# Altium schematic symbol library AD_Lib.SchLib: 1239 symbols (part 3 of 9) (continued)
## IC_LT3011EDD#PBF
designator IC?, comment LT3011
ÎÈÑ¹Ð¾Æ¬; LDO;3~80V;50mA;ADJ; Manufacturer: ADI; Value: 3.0V~80V,50mA; Quality: -40~125¡æ; pro-environment: RoHS; OPN: LT3011EDD#PBF; PadsNum: 0; SN: SN; Category: ¼¯³ÉÐ¾Æ¬; Part: LT3011; QTY: 121; Price: 17.7523; OPN_JLC: OPN_JLC; SN_JLC: SN_JLC; Price_JLC: 0
footprint DFN-10_3x3 (SON, 10-Leads, Body 3x3mm, Pitch 0.5mm, Microchip Recommended)
pins: 1 OUT (out), 2 ADJ (in), 3 GND (power), 4 NC, 5 PGD (out), 6 CT (out), 7 NC, 8 ~{SHDN} (in), 9 NC, 10 IN (in), 11 EPAD

## IC_LT4356IDE-1#PBF
designator IC?, comment LT4356
MOSFETÇý¶¯; Manufacturer: Linear; Quality: -40~125¡æ; Value: ADJ,4~80V; pro-environment: RoHS; SN: 03.4.11.11.75435601S; OPN: LT4356IDE-1#PBF; PadsNum: 0; Category: ¼¯³ÉÐ¾Æ¬; Part: LT4356; QTY: 91; Price: ?; OPN_JLC: OPN_JLC; SN_JLC: SN_JLC; Price_JLC: 0
footprint DFN-12_4x3 (SON, 12-Leads, Body 4x3mm, Pitch 0.5mm, Microchip Recommended)
pins: 0 GND (power), 1 TMR (in), 2 FB (in), 3 OUT (in), 4 GATE (out), 5 SNS (in), 6 VCC (power), 7 ~{SHDN} (in), 8 ~{FLT} (oc), 9 EN (in), 10 GND (power), 11 AOUT (out), 12 IN+ (in)

## IC_LT8302IS8E#PBF
designator IC?, comment LT8302
·´¼¤¿ØÖÆÆ÷£¬2.8~42V,3.5A/65V; Manufacturer: Linear; Quality: -40~125¡æ; pro-environment: RoHS; SN: 03.4.11.11.83830201S; OPN: LT8302IS8E#PBF; PadsNum: 0; Value: 2.8~42V,3.5A/65V; other: ·´¼¤¿ØÖÆÆ÷; Category: ¼¯³ÉÐ¾Æ¬; Part: LT8302; QTY: 100; Price: ?; OPN_JLC: OPN_JLC; SN_JLC: SN_JLC; Price_JLC: 0
footprint SO-8_HT (SOIC, 8-Leads, Body 4.9x3.9mm, Pitch 1.27mm, IPC Low Density)
pins: 1 EN (in), 2 INTVcc (out), 3 Vin (in), 4 GND (power), 5 SW, 6 Rfb (in), 7 Rref (in), 8 TC (in), 9 EP (power)
text: ·´¼¤; ¿Ø; ÖÆ; Æ÷

## IC_LT8471EFE#PBF
designator IC?, comment LT8471
Dual Multitopology DC/DC Converters with 2A Switches and Synchronization; Manufacturer: Linear; Quality: -40~125¡æ; Value: ADJ,4~80V; pro-environment: RoHS; OPN: LT8471EFE#PBF; PadsNum: 0; Part: LT8471; QTY: 91; Price: ?; OPN_JLC: OPN_JLC; SN_JLC: SN_JLC; Price_JLC: 0
footprint IC_LT8711EFE#PBF (FE Package 20-Lead Plastic TSSOP (4.4mm))
pins: 1 C1 (power), 2 E1 (power), 3 VIN1 (power), 4 PG1 (out), 5 FB1 (in), 6 OV/UV (in), 7 RT (in), 8 SS1 (power), 9 SYNC (in), 10 GND (power), 11 GND (power), 12 GND (power), 13 C3 (power), 14 SHOUT (power), 15 SS2 (power), 16 FB2 (in), 17 PG2 (out), 18 VIN2 (power), 19 E2 (power), 20 C2 (power), 21 GND (power) "Exposed Pad"

## IC_LTC1569CS87PBF
designator IC?, comment LTC1569-7
µÍÍ¨ÂË²¨Æ÷£¬3V~¡À5V£¬10½×; Manufacturer: Linear; Quality: -40~85¡æ; pro-environment: RoHS; SN: 03.4.11.13.83156901S; other: µÍÍ¨ÂË²¨Æ÷£¬3V~5V£¬10½×; OPN: LTC1569CS87PBF; PadsNum: 0; Value: 3V~¡À5V; Category: ¼¯³ÉÐ¾Æ¬; Part: LTC1569-7; QTY: 100; Price: ?; OPN_JLC: OPN_JLC; SN_JLC: SN_JLC; Price_JLC: 0
footprint SO-8 (SOIC, 8-Leads, Body 4.9x3.9mm, Pitch 1.27mm, IPC Low Density)
pins: 1 IN+ (in), 2 IN- (in), 3 GND (power), 4 V- (power), 5 DIV/CLK (in), 6 Rx, 7 V+ (power), 8 Vout (out)
text: µÍÍ¨; ÂË; ²¨; Æ÷

## IC_LTC3637IMSE#PBF
designator IC?, comment LTC3637
ÎÈÑ¹Ð¾Æ¬; ¿ª¹ØÐÍ; Êä³öµçÁ÷1A; Manufacturer: Linear; pro-environment: RoHS; Quality: -40~125¡æ; SN: 03.4.11.11.99363701S; Value: 76V,1A; OPN: LTC3637IMSE#PBF; PadsNum: 0; Category: ¼¯³ÉÐ¾Æ¬; Part: LTC3637; QTY: 37; Price: ?; OPN_JLC: OPN_JLC; SN_JLC: SN_JLC; Price_JLC: 0
footprint MSOP-16_HT (SOIC, 14-Leads, Body 8.7x3.9mm, Pitch 1.27mm, IPC Medium Density)
pins: 1 SW (out), 3 VIN (in), 5 FBO (out), 6 PG2 (in), 7 PG1 (in), 8 GND (power), 9 VFB (in), 10 SS (in), 11 Iset (in), 12 OVLO (in), 14 RUN (in), 16 GND (power), 17 HT

## IC_LTC6090CS8E#PBF
designator IC?, comment LTC6090
¸ßÑ¹ÔË·Å; Vs=9.5~140V; Manufacturer: ADI; Quality: -40~85¡æ; Value: 50mA;9.5V~140V;; pro-environment: RoHS; other: Vs=9.5~140V;SR=24V/us; OPN: LTC6090CS8E#PBF; PadsNum: 0; SN: SN; Category: ¼¯³ÉÐ¾Æ¬; Part: LTC6090; QTY: 100; Price: 33.4932; OPN_JLC: OPN_JLC; SN_JLC: SN_JLC; Price_JLC: 0
footprint SO-8_HT2 (SOIC, 8-Leads, Body 4.9x3.9mm, Pitch 1.27mm, IPC Low Density)
part A pins: 2 IN- (in), 3 IN+ (in), 6 OUT (out)
part B pins: 1 COM, 4 V- (power), 5 ~{TFLAG}, 7 V+ (power), 8 ~{OD} (in), 9 TH
part A text: Vcc; Vee

## IC_M45PE80-VMP6G
designator IC?, comment M45PE80
NOR Flash,64Mb; Manufacturer: Micron; pro-environment: RoHS; Quality: -40~85¡æ; SN: 03.4.11.16.70PE8001S; Value: 64Mb,3.3V; OPN: M45PE80-VMP6G; PadsNum: 0; Category: ¼¯³ÉÐ¾Æ¬; Part: M45PE80; QTY: 490; Price: ?; OPN_JLC: OPN_JLC; SN_JLC: SN_JLC; Price_JLC: 0
footprint VFQFPN-8 (Footprint not found)
pins: 1 SI (in), 2 SCK (in), 3 ~{RST} (in), 4 ~{CS} (in), 5 ~{WP} (in), 6 VCC (power), 7 GND (power), 8 SO (out)
text: NOR; Flash; 64Mbit

## IC_MAX539BESA+
designator IC?, comment MAX539
DA,1CH,SPI; Manufacturer: Maxim; Quality: -40~85¡æ; Value: 0.25V/us,12bit; pro-environment: RoHS; SN: 03.4.11.17.83539B01S; other: 1CH;12bit;4.5V~5.5V; OPN: MAX539BESA+; PadsNum: 0; Category: ¼¯³ÉÐ¾Æ¬; Part: MAX539; QTY: 100; Price: 42.12; OPN_JLC: OPN_JLC; SN_JLC: SN_JLC; Price_JLC: 0
footprint SO-8 (SOIC, 8-Leads, Body 4.9x3.9mm, Pitch 1.27mm, IPC Low Density)
pins: 1 DIN (in), 2 SCLK (in), 3 ~{CS} (in), 4 DOUT (out), 5 AGND (power), 6 RefIn (power), 7 VOUT (out), 8 VDD (power)
text: DA; ×ª; »»; Æ÷

## IC_MAX3221IPW
designator IC?, comment MAX3221
RS232ÊÕ·¢Æ÷; Manufacturer: TI; Quality: -40~85¡æ; Value: 250kbit/s,3~5.5V; pro-environment: RoHS; OPN: MAX3221IPW; PadsNum: 0; SN: SN; Category: ¼¯³ÉÐ¾Æ¬; Part: MAX3221; QTY: 90; Price: 11.5479; OPN_JLC: OPN_JLC; SN_JLC: SN_JLC; Price_JLC: 0
footprint TSSOP-14 (Shrink Small Outline; 14 Leads; Body Width 4.4 mm; Pitch 0.65 mm)
pins: 1 ~{EN} (in), 2 C1+, 3 V+, 4 C1-, 5 C2+, 6 C2-, 7 V-, 8 RIN (in), 9 ROUT (out), 10 ~{INVALID} (out), 11 DIN (in), 12 FORCEON (in), 13 DOUT (out), 14 GND (power), 15 VCC (power), 16 ~{FORCEOFF} (in)

## IC_MAX5741EUB+
designator IC?, comment MAX5741
DA;SPI;125kS/s;4Í¨µÀ;; Manufacturer: Maxim; Quality: -40~105¡æ; Value: 125 kS/s,10bit; pro-environment: RoHS; other: 125 kS/s;10bit;2.7V~5.5V; OPN: MAX5741EUB+; PadsNum: 0; SN: SN; Category: ¼¯³ÉÐ¾Æ¬; Part: MAX5741; QTY: 50; Price: 44.5672; OPN_JLC: OPN_JLC; SN_JLC: SN_JLC; Price_JLC: 0
footprint MSOP-10 (Body Width 3 mm; Pitch 0.5 mm;(uMAX-10&RM-10))
pins: 1 ~{CS} (in), 2 SCLK (in), 3 VDD (power), 4 GND (power), 5 DIN (in), 6 RefIn (in), 7 VoutA (out), 8 VoutB (out), 9 VoutC (out), 10 VoutD (out)
text: DA; ×ª; »»; Æ÷

## IC_MAX7219ENG+
designator IC?, comment MAX7219
ÊýÂë¹ÜÇý¶¯,SPI,8*8,5V; Manufacturer: Maxim; pro-environment: RoHS; Quality: -40~85¡æ; SN: 03.4.11.20.11721901S; Value: SPI,5V; OPN: MAX7219ENG+; other: SPI;8Seg*8Bit;4~5.5V;-2~5mA; PadsNum: 0; Category: ¼¯³ÉÐ¾Æ¬; Part: MAX7219; QTY: 15; Price: 64.0341; OPN_JLC: OPN_JLC; SN_JLC: SN_JLC; Price_JLC: 0
footprint DIP-24 (DIP, 24-Leads, Row Spacing 7.62mm, Pitch 2.54mm, Body 30.55x6.99mm)
pins: 1 DIN (in), 2 DIG0 (out), 3 DIG4 (out), 4 GND (power), 5 DIG6 (out), 6 DIG2 (out), 7 DIG3 (out), 8 DIG7 (out), 9 GND (power), 10 DIG5 (out), 11 DIG1 (out), 12 LOAD (in), 13 CLK (in), 14 SEG A (out), 15 SEG F (out), 16 SEG B (out), 17 SEG G (out), 18 ISET, 19 V+ (power), 20 SEG C (out), 21 SEG E (out), 22 SEG DP (out), 23 SEG D (out), 24 DOUT (out)

## IC_MAX7426EUA
designator IC?, comment MAX7426
µÍÍ¨ÂË²¨Æ÷; 2.7~3.6V; 5½×; 12kHz; Manufacturer: Maxim; Quality: -40~85¡æ; Value: 2.7V~3.6V; pro-environment: RoHS; other: µÍÍ¨ÂË²¨Æ÷, 2.7V~3.6V, 5½×, 12KHz; OPN: MAX7426EUA; PadsNum: 0; SN: SN; Category: ¼¯³ÉÐ¾Æ¬; Part: MAX7426; QTY: 50; Price: 15.1983; OPN_JLC: OPN_JLC; SN_JLC: SN_JLC; Price_JLC: 0
footprint MSOP-8 (Shrink Small Outline; 8 Leads; Body Width 3 mm; Pitch 0.65 mm)
pins: 1 COM (in), 2 IN (in), 3 GND (power), 4 VDD (power), 5 OUT (out), 6 OS, 7 ~{SHDN} (in), 8 CLK (in)
text: µÍÍ¨; ÂË; ²¨; Æ÷

## IC_MAX11628EEE+
designator IC?, comment MAX11628
AD, 8Í¨µÀ, 12bit, SPI, 5V; Manufacturer: Maxim; Quality: -40~85¡æ; Value: 300 kS/s£¬12bit; pro-environment: RoHS; other: 300 kS/s;12bit;4.75V~5.25V; OPN: MAX11628EEE+; PadsNum: 0; SN: SN; Category: ¼¯³ÉÐ¾Æ¬; Part: MAX11628; QTY: 100; Price: 31.7538; OPN_JLC: OPN_JLC; SN_JLC: SN_JLC; Price_JLC: 0
footprint QSOP-16 (Footprint not found)
pins: 1 AIN0 (in), 2 AIN1 (in), 3 AIN2 (in), 4 AIN3 (in), 5 AIN4 (in), 6 AIN5 (in), 7 AIN6 (in), 8 AIN7/~{CNST} (in), 9 REF (in), 10 GND (power), 11 VDD (power), 12 ~{CS} (power), 13 SCLK (in), 14 DIN (in), 15 DOUT (out), 16 ~{EOC} (out)
text: AD; ×ª»»Æ÷; 12bit, SPI

## IC_MAX13487EESA
designator IC?, comment MAX13487
RS485ÊÕ·¢Æ÷,°ëË«¹¤,×ÔÊÕ·¢,4.75~5.25V; Manufacturer: Maxim; Quality: -40~85¡æ; Value: RS485,500kbps; pro-environment: RoHS; OPN: MAX13487EESA; PadsNum: 8; SN: SN; other: 4.75~5.25V; Category: ¼¯³ÉÐ¾Æ¬; Part: MAX13487; QTY: 75; Price: 4.03; OPN_JLC: MAX13487EESA; SN_JLC: C18347; Price_JLC: 4.03
footprint SO-8 (SOIC, 8-Leads, Body 4.9x3.9mm, Pitch 1.27mm, IPC Low Density)
pins: 1 R (out), 2 ~{RE} (in), 3 ~{SHDN} (in), 4 D (in), 5 GND (power), 6 A (io), 7 B (io), 8 VCC (power)

## IC_MAX14932
designator IC?, comment MAX14932
Êý×Ö¸ôÀëÆ÷,1In1Out,2.7~5.5V; Manufacturer: Maxim; Quality: -40~125°C; pro-environment: RoHS; Value: 150MBd; PadsNum: 0; Category: Digital Isolators; OPN: MAX14932; Part: MAX14932; QTY: 100; OPN_JLC: OPN_JLC; Price_JLC: 0
footprint SOIC127P1032X265-16N
pins: 1 VDDA (power), 2 GNDA (power), 3 INA1 (in), 4 INA2 (in), 5 OUTA1 (out), 6 OUTA2 (out), 7 ENA (in), 8 GNDA (power), 9 GNDB (power), 10 ENB (in), 11 INB2 (in), 12 INB1 (in), 13 OUTB2 (out), 14 OUTB1 (out), 15 GNDB (power), 16 VDDB (power)

## IC_MC74HC74ADG
designator IC?, comment MC74HC74A
D´¥·¢Æ÷;2P;3.3/5V; Manufacturer: ON; pro-environment: RoHS; Quality: -40~125¡æ; SN: 03.4.11.18.84HC7401S; Value: D-Type Flip-Flop; OPN: MC74HC74ADG; other: Vcc=2V~6V;D´¥·¢Æ÷; PadsNum: 0; Category: ¼¯³ÉÐ¾Æ¬; Part: MC74HC74A; QTY: 55; Price: 1.09161; OPN_JLC: OPN_JLC; SN_JLC: SN_JLC; Price_JLC: 0
footprint SO-14 (14-Pin Small Outline Integrated Circuit 1.27 mm Pitch, IPC Low Density)
pins: 1 RST1 (in), 2 DAT1 (in), 3 CLK1 (in), 4 SET1 (in), 5 Q1 (out), 6 ~{Q1} (out), 7 GND (power), 8 ~{Q2} (out), 9 Q2 (out), 10 SET2 (in), 11 CLK2 (in), 12 DAT2 (in), 13 RST2 (in), 14 VCC (power)
text: D ´¥·¢Æ÷

## IC_MC74HC74ADR2G
designator IC?, comment MC74HC74A
D´¥·¢Æ÷,2P;3.3/5V; Manufacturer: ON; pro-environment: RoHS; Quality: -40~125¡æ; Value: D-Type Flip-Flop; OPN: MC74HC74ADR2G; other: Vcc=2V~6V;D´¥·¢Æ÷; PadsNum: 0; SN: SN; Category: ¼¯³ÉÐ¾Æ¬; Part: MC74HC74A; QTY: 55; Price: 1.09161; OPN_JLC: OPN_JLC; SN_JLC: SN_JLC; Price_JLC: 0
footprint SO-14 (14-Pin Small Outline Integrated Circuit 1.27 mm Pitch, IPC Low Density)
pins: 1 RST1 (in), 2 DAT1 (in), 3 CLK1 (in), 4 SET1 (in), 5 Q1 (out), 6 ~{Q1} (out), 7 GND (power), 8 ~{Q2} (out), 9 Q2 (out), 10 SET2 (in), 11 CLK2 (in), 12 DAT2 (in), 13 RST2 (in), 14 VCC (power)
text: D ´¥·¢Æ÷

## IC_MC74VHC1G86DTT1G
designator IC?, comment MC74VHC1G86
Âß¼­ÃÅ_Òì»òÃÅ,1P,2.0~5.5V; Manufacturer: ON; pro-environment: RoHS; Quality: -40~85¡æ; SN: 03.4.11.18.491G8601S; Other: µ¥Í¨µÀ2ÊäÈëÒì»òÃÅ; Value: XOR,2.0~5.5V; OPN: MC74VHC1G86DTT1G; PadsNum: 0; Category: ¼¯³ÉÐ¾Æ¬; Part: MC74VHC1G86; QTY: 3000; Price: 0.44694; OPN_JLC: OPN_JLC; SN_JLC: SN_JLC; Price_JLC: 0
footprint SOT353_M (SOT353, 5-Leads, Body 2x1.3mm, Pitch 0.65mm, Lead Span 2.1mm, IPC Low Density)
footprint SOT23-5 (SOT23, 5-Leads, Body 2.9x1.6mm, Pitch 0.95mm, Lead Span 2.7mm, IPC Low Density)
pins: 1 A (in), 2 B (in), 3 GND (power), 4 Y (out), 5 VDD (power)
text: Vcc; XOR; Gnd

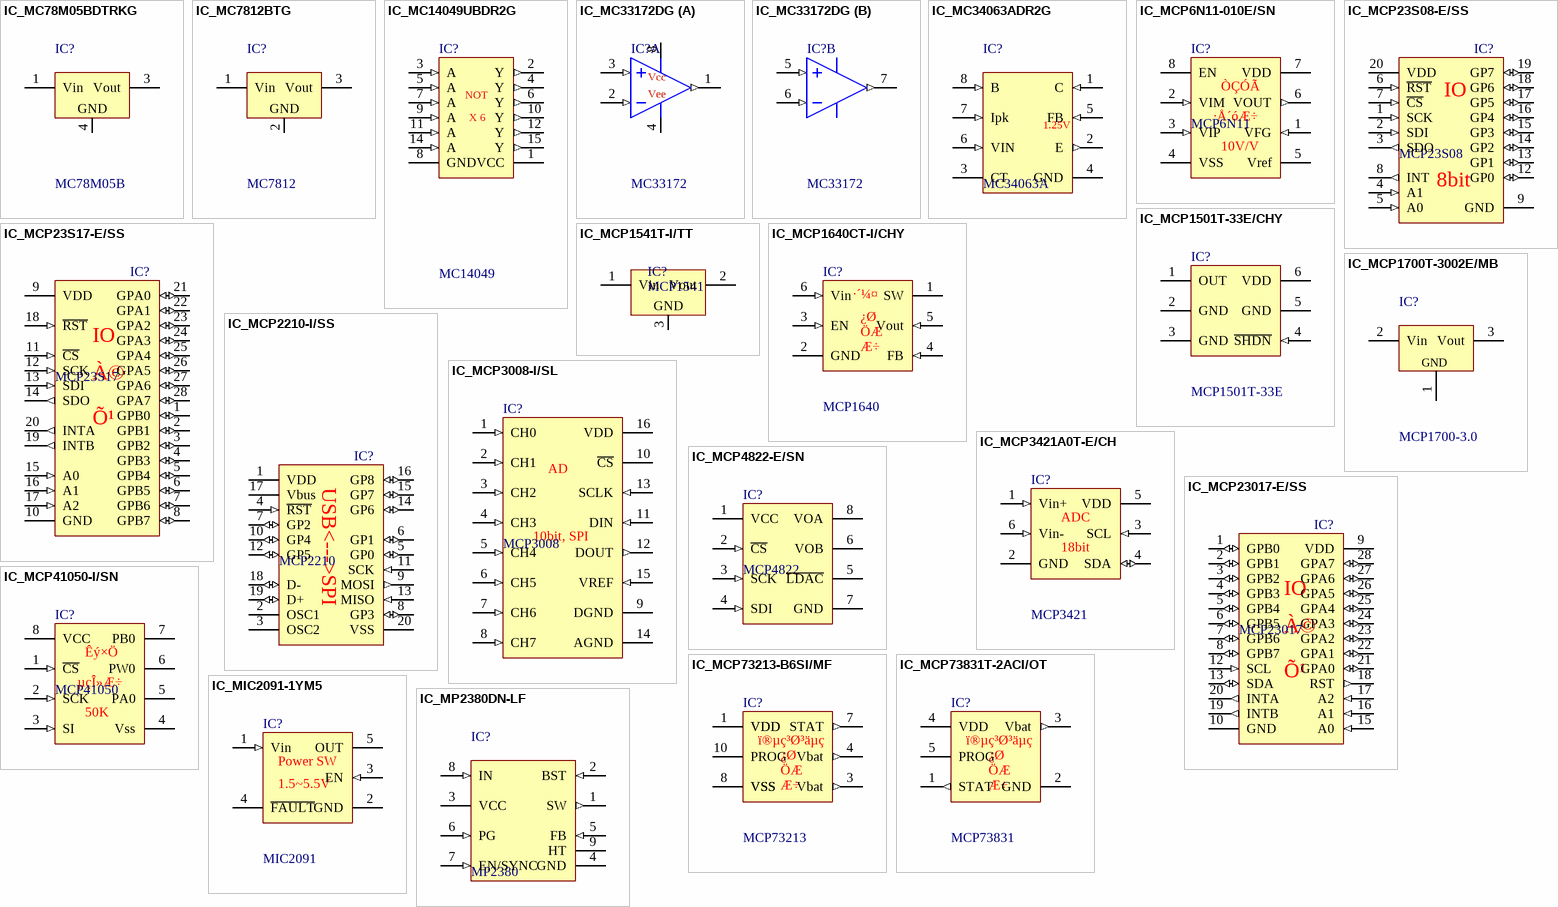
[diagram p12: symbols IC_MC78M05BDTRKG to IC_MP2380DN-LF]

## IC_MC78M05BDTRKG
designator IC?, comment MC78M05B
ÎÈÑ¹Ð¾Æ¬; LDO; Êä³öµçÁ÷0.5A; Manufacturer: ON; pro-environment: RoHS; Quality: -40~85¡æ; SN: 03.4.11.13.31780501S; Value: 35V,0.5A; OPN: MC78M05BDTRKG; PadsNum: 0; Category: ¼¯³ÉÐ¾Æ¬; Part: MC78M05B; QTY: 2500; Price: 1.2168; OPN_JLC: OPN_JLC; SN_JLC: SN_JLC; Price_JLC: 0
footprint TO252-3 (D-PAK, 4-Leads, Body 6.1x6.5mm, Pitch 2.28mm, Lead Span 9.8mm, IPC Low Density)
pins: 1 Vin, 3 Vout, 4 GND (power)

## IC_MC7812BTG
designator IC?, comment MC7812
ÎÈÑ¹Ð¾Æ¬; LDO; 12V/1A; Manufacturer: ON; pro-environment: RoHS; Quality: -40~125¡æ; Value: 12V,1A; OPN: MC7812BTG; PadsNum: 0; SN: SN; Category: ¼¯³ÉÐ¾Æ¬; Part: MC7812; QTY: 50; Price: ?; OPN_JLC: MC7812BTG; SN_JLC: C45387; Price_JLC: 1.93
footprint TO220-3 (TO, Thru-Hole, Vertical, Heatsink Mounted; 3 In-Line Leads; Pitch 2.54 mm)
pins: 0 GND (power), 1 Vin, 2 GND (power), 3 Vout

## IC_MC14049UBDR2G
designator IC?, comment MC14049
Âß¼­ÃÅ_·ÇÃÅ; 6P; 3.0~18V; Manufacturer: ON Semiconductor; pro-environment: RoHS; Quality: -55~150¡æ; Value: NOT,3.0~18V; OPN: MC14049UBDR2G; PadsNum: 16; SN: SN; Category: ¼¯³ÉÐ¾Æ¬; Part: MC14049; QTY: 2500; Price: 1.01135; OPN_JLC: MC14049UBDR2G; SN_JLC: C233449; Price_JLC: 0.8721
footprint SO-16_N (SOIC, 16-Leads, Body 9.9x3.9mm, Pitch 1.27mm, IPC Medium Density)
pins: 1 VCC (power), 2 Y (out), 3 A (in), 4 Y (out), 5 A (in), 6 Y (out), 7 A (in), 8 GND (power), 9 A (in), 10 Y (out), 11 A (in), 12 Y (out), 14 A (in), 15 Y (out)
text: NOT; X 6

## IC_MC33172DG
designator IC?, comment MC33172
OPA; 2P; Io=0.31A; Manufacturer: ON; Quality: -40~85¡æ; Value: ¡À1.5V~¡À12V;3V~24V;; pro-environment: RoHS; other: Io=310mA;SR=53V/us; OPN: MC33172DG; PadsNum: 0; SN: SN; Category: ¼¯³ÉÐ¾Æ¬; Part: MC33172; QTY: 98; Price: ?; OPN_JLC: OPN_JLC; SN_JLC: SN_JLC; Price_JLC: 0
footprint SO-8 (SOIC, 8-Leads, Body 4.9x3.9mm, Pitch 1.27mm, IPC Low Density)
part A pins: 1 OUTA (out), 2 INA- (in), 3 INA+ (in), 4 VEE (power), 8 VCC (power)
part B pins: 5 INB+ (in), 6 INB- (in), 7 OUTB (out)
part A text: Vcc; Vee

## IC_MC34063ADR2G
designator IC?, comment MC34063A
ÎÈÑ¹Ð¾Æ¬; ¿ª¹ØÐÍ; Éý½µÑ¹; 3~40V; 1.5A; Manufacturer: ON; pro-environment: RoHS; Quality: -0~70¡æ; Value: 40V,1.5A; OPN: MC34063ADR2G; other: Vin=3V~40V,Éý½µÑ¹, Iout=1.5A; PadsNum: 8; SN: SN; Category: ¼¯³ÉÐ¾Æ¬; Part: MC34063A; QTY: 2500; Price: ?; OPN_JLC: MC34063ADR2G; SN_JLC: C32078; Price_JLC: 1.7
footprint IC_MC34063ADR2G (¿íÌåSO8,Ìå¿í150mil)
pins: 1 C (in), 2 E (out), 3 CT, 4 GND (power), 5 FB (in), 6 VIN (in), 7 Ipk (in), 8 B (in)
text: 1.25V

## IC_MCP6N11-010E/SN
designator IC?, comment MCP6N11
ÒÇÓÃÔË·Å;10V/V;1.8V~5.5V; Manufacturer: Microchip; pro-environment: RoHS; Quality: -40~85¡æ; OPN: MCP6N11-010E/SN; other: ÒÇÓÃÔË·Å,10V/V,1.8V~5.5V; PadsNum: 0; SN: SN; Value: 10V/V;1.8V~5.5V; Category: ¼¯³ÉÐ¾Æ¬; Part: MCP6N11; QTY: 100; Price: 8.3636; OPN_JLC: OPN_JLC; SN_JLC: SN_JLC; Price_JLC: 0
footprint SO-8 (SOIC, 8-Leads, Body 4.9x3.9mm, Pitch 1.27mm, IPC Low Density)
pins: 1 VFG (in), 2 VIM (in), 3 VIP (in), 4 VSS (power), 5 Vref, 6 VOUT (out), 7 VDD (power), 8 EN (power)
text: ÒÇÓÃ; ·Å´óÆ÷; 10V/V

## IC_MCP23S08-E/SS
designator IC?, comment MCP23S08
IO Expanders ,8bit,SPIC; Manufacturer: Microchip; Value: 1.8V~5.5V,8bit; Quality: -40~125°C; other: IO Expanders;1.8V~5.5V;8bit;SPI; pro-environment: RoHS; OPN: MCP23S08-E/SS; PadsNum: 0; SN: SN; Category: Interface - I/O Expanders; Part: MCP23S08; QTY: 67; OPN_JLC: OPN_JLC; SN_JLC: SN_JLC; Price_JLC: 0
footprint SSOP-20_W5.3 (SOP, 20-Leads, Body 7.2x5.3mm, Pitch 0.65mm, IPC Low Density)
pins: 1 SCK (in), 2 SDI (in), 3 SDO (out), 4 A1 (in), 5 A0 (in), 6 ~{RST} (in), 7 ~{CS} (in), 8 INT (out), 9 GND (power), 12 GP0 (io), 13 GP1 (io), 14 GP2 (io), 15 GP3 (io), 16 GP4 (io), 17 GP5 (io), 18 GP6 (io), 19 GP7 (io), 20 VDD (power)
text: IO; 8bit

## IC_MCP23S17-E/SS
designator IC?, comment MCP23S17
IO¿ÚÀ©Õ¹,16bit,SPI; Manufacturer: Microchip; Value: 1.8V~5.5V,16bit; Quality: -40~125¡æ; other: IO¿ÚÀ©Õ¹;1.8V~5.5V;16bit;SPI; pro-environment: RoHS; OPN: MCP23S17-E/SS; PadsNum: 0; SN: SN; Category: ¼¯³ÉÐ¾Æ¬; Part: MCP23S17; QTY: 40; Price: 8.99; OPN_JLC: OPN_JLC; SN_JLC: SN_JLC; Price_JLC: 0
footprint SSOP-28_W5.3 (SSOP, Plastic; 28 Leads; Body Width 5.3 mm; Pitch 0.65 mm)
pins: 1 GPB0 (io), 2 GPB1 (io), 3 GPB2 (io), 4 GPB3 (io), 5 GPB4 (io), 6 GPB5 (io), 7 GPB6 (io), 8 GPB7 (io), 9 VDD (power), 10 GND (power), 11 ~{CS} (in), 12 SCK (in), 13 SDI (in), 14 SDO (out), 15 A0 (in), 16 A1 (in), 17 A2 (in), 18 ~{RST} (in), 19 INTB (out), 20 INTA (out), 21 GPA0 (io), 22 GPA1 (io), 23 GPA2 (io), 24 GPA3 (io), 25 GPA4 (io), 26 GPA5 (io), 27 GPA6 (io), 28 GPA7 (io)
text: IO; À©; Õ¹

## IC_MCP1501T-33E/CHY
designator IC?, comment MCP1501T-33E
3.3 High-Precision Buffered Voltage Reference; Manufacturer: Microchip; Quality: -40~85¡æ; Value: 1.65V - 5.5V , 20mA; pro-environment: RoHS; OPN: MCP1501T-33E/CHY; PadsNum: 0; SN: SN; Category: Voltage Reference; Part: MCP1501T-33E; QTY: 120; OPN_JLC: OPN_JLC; SN_JLC: SN_JLC; Price_JLC: 0
footprint SOT23-6 (SOT23, 6-Leads, Body 2.9x1.6mm, Pitch 0.95mm, Lead Span 2.7mm, IPC Low Density)
pins: 1 OUT (power), 2 GND (power), 3 GND (power), 4 ~{SHDN} (in), 5 GND (power), 6 VDD (power)

## IC_MCP1541T-I/TT
designator IC?, comment MCP1541
µçÑ¹²Î¿¼Ô´; 1%;50ppm;8mA; Manufacturer: Microchip; pro-environment: RoHS; Quality: -40~85¡æ; Value: 4.096V; OPN: MCP1541T-I/TT; other: Vin<37V;Vout<36V; 2%;92ppm;0.1A; PadsNum: 0; SN: SN; Part: MCP1541; Category: ÎÈÑ¹¶þ¼«¹Ü; QTY: 3000; Price: 4.6449; OPN_JLC: OPN_JLC; SN_JLC: SN_JLC; Price_JLC: 0
footprint SOT23-3 (SOT-23; 3 Leads; Body 3.0 x 2.5 mm, inc. leads (LxW max))
pins: 1 Vin (power), 2 Vout, 3 GND (power)

## IC_MCP1640CT-I/CHY
designator IC?, comment MCP1640
·´¼¤¿ØÖÆÆ÷; 0.35~5.5V; 0.35A/3.3V; Manufacturer: Microchip; Quality: -40~85¡æ; Value: 0.35~5.5V,0.35A/3.3V; pro-environment: RoHS; OPN: MCP1640CT-I/CHY; PadsNum: 0; SN: SN; other: ·´¼¤¿ØÖÆÆ÷; Category: ¼¯³ÉÐ¾Æ¬; Part: MCP1640; QTY: 3000; Price: 3.6738; OPN_JLC: OPN_JLC; SN_JLC: SN_JLC; Price_JLC: 0
footprint SOT23-6 (SOT23, 6-Leads, Body 2.9x1.6mm, Pitch 0.95mm, Lead Span 2.7mm, IPC Low Density)
pins: 1 SW, 2 GND (power), 3 EN (in), 4 FB (in), 5 Vout (in), 6 Vin (in)
text: ·´¼¤; ¿Ø; ÖÆ; Æ÷

## IC_MCP1700T-3002E/MB
designator IC?, comment MCP1700-3.0
ÎÈÑ¹Ð¾Æ¬; LDO; Êä³öµçÁ÷0.25A ; µÍÑ¹²î; Manufacturer: Microchip; pro-environment: RoHS; Quality: -40~125¡æ; Value: 3V,0.25A; OPN: MCP1700T-3002E/MB; other: Vin=2.3~6V;Vout=3V;×î´óÑ¹½µ=0.35V; PadsNum: 0; SN: SN; Category: ¼¯³ÉÐ¾Æ¬; Part: MCP1700-3.0; QTY: 1000; Price: 2.2148; OPN_JLC: OPN_JLC; SN_JLC: SN_JLC; Price_JLC: 0
footprint SOT89-3 (TO-243AA, 3-Leads, Body 4.5x2.4 mm, Pitch 1.5mm, Lead Span 4.1mm, IPC Medium Density)
pins: 1 GND, 2 Vin, 3 Vout

## IC_MCP2210-I/SS
designator IC?, comment MCP2210
IO¿ÚÀ©Õ¹,8bit,SPIC; Manufacturer: Microchip; Value: 3.3V~5.5V,12Mb/s; Quality: -40~125¡æ; other: USB<->SPI;3.3V~5.5V;12 Mb/s; pro-environment: RoHS; OPN: MCP2210-I/SS; PadsNum: 0; SN: SN; Category: ¼¯³ÉÐ¾Æ¬; Part: MCP2210; QTY: 67; Price: 11.6051; OPN_JLC: OPN_JLC; SN_JLC: SN_JLC; Price_JLC: 0
footprint SSOP-20_W5.3 (SOP, 20-Leads, Body 7.2x5.3mm, Pitch 0.65mm, IPC Low Density)
pins: 1 VDD (power), 2 OSC1, 3 OSC2, 4 ~{RST} (in), 5 GP0 (io), 6 GP1 (io), 7 GP2 (io), 8 GP3 (io), 9 MOSI (out), 10 GP4 (io), 11 SCK (in), 12 GP5 (io), 13 MISO (in), 14 GP6 (io), 15 GP7 (io), 16 GP8 (io), 17 Vbus (power), 18 D- (io), 19 D+ (io), 20 VSS (power)
text: USB<--->SPI

## IC_MCP3008-I/SL
designator IC?, comment MCP3008
AD, 8CH, 10bit, SPI, 2.7~5V; Manufacturer: Microchip; Quality: -40~85°C; Value: 200 kS/s,10bit; pro-environment: RoHS; other: 200 kS/s;10bit;2.7V~5.5V; OPN: MCP3008-I/SL; PadsNum: 0; SN: SN; Category: Analog to Digital Converters - ADC; Part: MCP3008; QTY: 50; Price_JLC: 0
footprint SO-16 (16-Pin Small Outline Package 1.27 mm Pitch, IPC Low Density)
pins: 1 CH0 (in), 2 CH1 (in), 3 CH2 (in), 4 CH3 (in), 5 CH4 (in), 6 CH5 (in), 7 CH6 (in), 8 CH7 (in), 9 DGND (power), 10 ~{CS} (power), 11 DIN (in), 12 DOUT (out), 13 SCLK (in), 14 AGND (power), 15 VREF (in), 16 VDD (power)
text: AD; 10bit, SPI

## IC_MCP3421A0T-E/CH
designator IC?, comment MCP3421
ADC; 18bit; IIC; 2.75~5.5V;; Manufacturer: Microchip; Quality: -40~125¡æ; pro-environment: RoHS; other: ADC; ²î·ÖÊäÈë; IIC; OPN: MCP3421A0T-E/CH; PadsNum: 0; Value: AdC; 18bit; IIC; 2.75~5.5V;; SN: SN; Category: ¼¯³ÉÐ¾Æ¬; Part: MCP3421; QTY: 3000; Price: 15.1047; OPN_JLC: OPN_JLC; SN_JLC: SN_JLC; Price_JLC: 0
footprint SOT23-6 (SOT23, 6-Leads, Body 2.9x1.6mm, Pitch 0.95mm, Lead Span 2.7mm, IPC Low Density)
pins: 1 Vin+ (in), 2 GND (power), 3 SCL (in), 4 SDA (io), 5 VDD (power), 6 Vin- (in)
text: ADC; 18bit

## IC_MCP4822-E/SN
designator IC?, comment MCP4822
DAC; SPI; 12bit; 2Í¨µÀ; 2.7V~5.5V; Manufacturer: Microchip; pro-environment: RoHS; Quality: -40~125¡æ; OPN: MCP4822-E/SN; other: ÄÚ²¿²Î¿¼Ô´; PadsNum: 8; SN: SN; Category: ¼¯³ÉÐ¾Æ¬; Part: MCP4822; QTY: 100; Price: 18.3738; OPN_JLC: MCP4822-E/SN; SN_JLC: C16040; Price_JLC: 11.11
footprint SO-8 (SOIC, 8-Leads, Body 4.9x3.9mm, Pitch 1.27mm, IPC Low Density)
pins: 1 VCC (power), 2 ~{CS} (in), 3 SCK (in), 4 SDI (in), 5 ~{LDAC}, 6 VOB, 7 GND (power), 8 VOA

## IC_MCP23017-E/SS
designator IC?, comment MCP23017
IO¿ÚÀ©Õ¹,16bit,IIC; Manufacturer: Microchip; Value: 1.8V~5.5V,16bit; Quality: -40~125¡æ; other: IO¿ÚÀ©Õ¹;1.8V~5.5V;16bit;IIC; pro-environment: RoHS; OPN: MCP23017-E/SS; PadsNum: 0; SN: SN; Category: ¼¯³ÉÐ¾Æ¬; Part: MCP23017; QTY: 47; Price: ?; OPN_JLC: OPN_JLC; SN_JLC: SN_JLC; Price_JLC: 0
footprint SSOP-28_W5.3 (SSOP, Plastic; 28 Leads; Body Width 5.3 mm; Pitch 0.65 mm)
pins: 1 GPB0 (io), 2 GPB1 (io), 3 GPB2 (io), 4 GPB3 (io), 5 GPB4 (io), 6 GPB5 (io), 7 GPB6 (io), 8 GPB7 (io), 9 VDD (power), 10 GND (power), 12 SCL (in), 13 SDA (io), 15 A0 (in), 16 A1 (in), 17 A2 (in), 18 RST (out), 19 INTB (out), 20 INTA (out), 21 GPA0 (io), 22 GPA1 (io), 23 GPA2 (io), 24 GPA3 (io), 25 GPA4 (io), 26 GPA5 (io), 27 GPA6 (io), 28 GPA7 (io)
text: IO; À©; Õ¹

## IC_MCP41050-I/SN
designator IC?, comment MCP41050
Êý×ÖµçÎ»Æ÷,SPI,50k¦¸,2.7V~5.5V; Manufacturer: Microchip; pro-environment: RoHS; Quality: -40~85¡æ; SN: 03.4.38.29.82410501S; OPN: MCP41050-I/SN; other: SPI£¬50k£¬256·Ö½ÓÍ·; PadsNum: 0; Value: 50k¦¸,2.7V~5.5V; Category: ¼¯³ÉÐ¾Æ¬; Part: MCP41050; QTY: 100; Price: 8.1666; OPN_JLC: OPN_JLC; SN_JLC: SN_JLC; Price_JLC: 0
footprint SO-8 (SOIC, 8-Leads, Body 4.9x3.9mm, Pitch 1.27mm, IPC Low Density)
pins: 1 ~{CS} (in), 2 SCK (in), 3 SI (in), 4 Vss (power), 5 PA0, 6 PW0, 7 PB0, 8 VCC (power)
text: Êý×Ö; µçÎ»Æ÷; 50K

## IC_MCP73213-B6SI/MF
designator IC?, comment MCP73213
ï®µç³Ø³äµç¹ÜÀí; 4.2~13V; 1.1A/8.2V; Manufacturer: Microchip; Quality: -40~85¡æ; Value: 4.2~13V; 8.2V; 130mA~1100mA; pro-environment: RoHS; other: ï®µç³ØÏßÐÔ³äµç¿ØÖÆÆ÷,Ë«µç³Ø; OPN: MCP73213-B6SI/MF; PadsNum: 0; SN: SN; Category: ¼¯³ÉÐ¾Æ¬; Part: MCP73213; QTY: 120; Price: 11.0432; OPN_JLC: OPN_JLC; SN_JLC: SN_JLC; Price_JLC: 0
footprint DFN-10_3x3 (SON, 10-Leads, Body 3x3mm, Pitch 0.5mm, Microchip Recommended)
pins: 1 VDD (power), 2 VDD (power), 3 Vbat (out), 4 Vbat (out), 7 STAT (out), 8 VSS (power), 9 VSS (power), 10 PROG, 11 VSS (power)
text: ï®µç³Ø³äµç; ¿Ø; ÖÆ; Æ÷

## IC_MCP73831T-2ACI/OT
designator IC?, comment MCP73831
ï®µç³Ø³äµç¹ÜÀí; 3.75~6V; 0.5A/4.2V; Manufacturer: Microchip; Quality: -40~85¡æ; Value: 3.75~6V; 4.2V; 15mA~500mA; pro-environment: RoHS; other: ï®µç³ØÏßÐÔ³äµç¿ØÖÆÆ÷; OPN: MCP73831T-2ACI/OT; PadsNum: 0; SN: SN; Category: ¼¯³ÉÐ¾Æ¬; Part: MCP73831; QTY: 3000; Price: 3.4983; OPN_JLC: OPN_JLC; SN_JLC: SN_JLC; Price_JLC: 0
footprint SOT23-5 (SOT23, 5-Leads, Body 2.9x1.6mm, Pitch 0.95mm, Lead Span 2.7mm, IPC Low Density)
pins: 1 STAT (out), 2 GND (power), 3 Vbat (out), 4 VDD (power), 5 PROG
text: ï®µç³Ø³äµç; ¿Ø; ÖÆ; Æ÷

## IC_MIC2091-1YM5
designator IC?, comment MIC2091
µçÔ´¿ª¹Ø; 1CH; 1.2¦¸; 1.5~5.5V;; Manufacturer: Microchip; Quality: -40~125¡æ; Value: µçÔ´¿ª¹Ø; 1CH; 1.5~5.5V;; pro-environment: RoHS; OPN: MIC2091-1YM5; PadsNum: 0; SN: SN; other: µçÔ´¿ª¹Ø; 1CH; 1.2¦¸; 1.5~5.5V;; Category: ¼¯³ÉÐ¾Æ¬; Part: MIC2091; QTY: 3000; Price: 1.218; OPN_JLC: OPN_JLC; SN_JLC: SN_JLC; Price_JLC: 0
footprint SOT23-5 (SOT23, 5-Leads, Body 2.9x1.6mm, Pitch 0.95mm, Lead Span 2.7mm, IPC Low Density)
pins: 1 Vin (in), 2 GND (power), 3 EN (in), 4 ~{FAULT} (oe), 5 OUT (power)
text: Power SW; 1.5~5.5V

## IC_MP2380DN-LF
designator IC?, comment MP2380
ÎÈÑ¹Ð¾Æ¬; ¿ª¹ØÐÍ; Êä³öµçÁ÷5A; Manufacturer: Monolithic Power Systems (MPS); pro-environment: RoHS; Quality: -40~85¡æ; SN: 03.4.11.11.83238001S; Value: 21V,5A; OPN: MP2380DN-LF; PadsNum: 0; Category: ¼¯³ÉÐ¾Æ¬; Part: MP2380; QTY: 100; Price: ?; OPN_JLC: OPN_JLC; SN_JLC: SN_JLC; Price_JLC: 0
footprint SO-8_HT (SOIC, 8-Leads, Body 4.9x3.9mm, Pitch 1.27mm, IPC Low Density)
pins: 1 SW (out), 2 BST (in), 3 VCC (power), 4 GND (power), 5 FB (in), 6 PG (in), 7 EN/SYNC (in), 8 IN (in), 9 HT

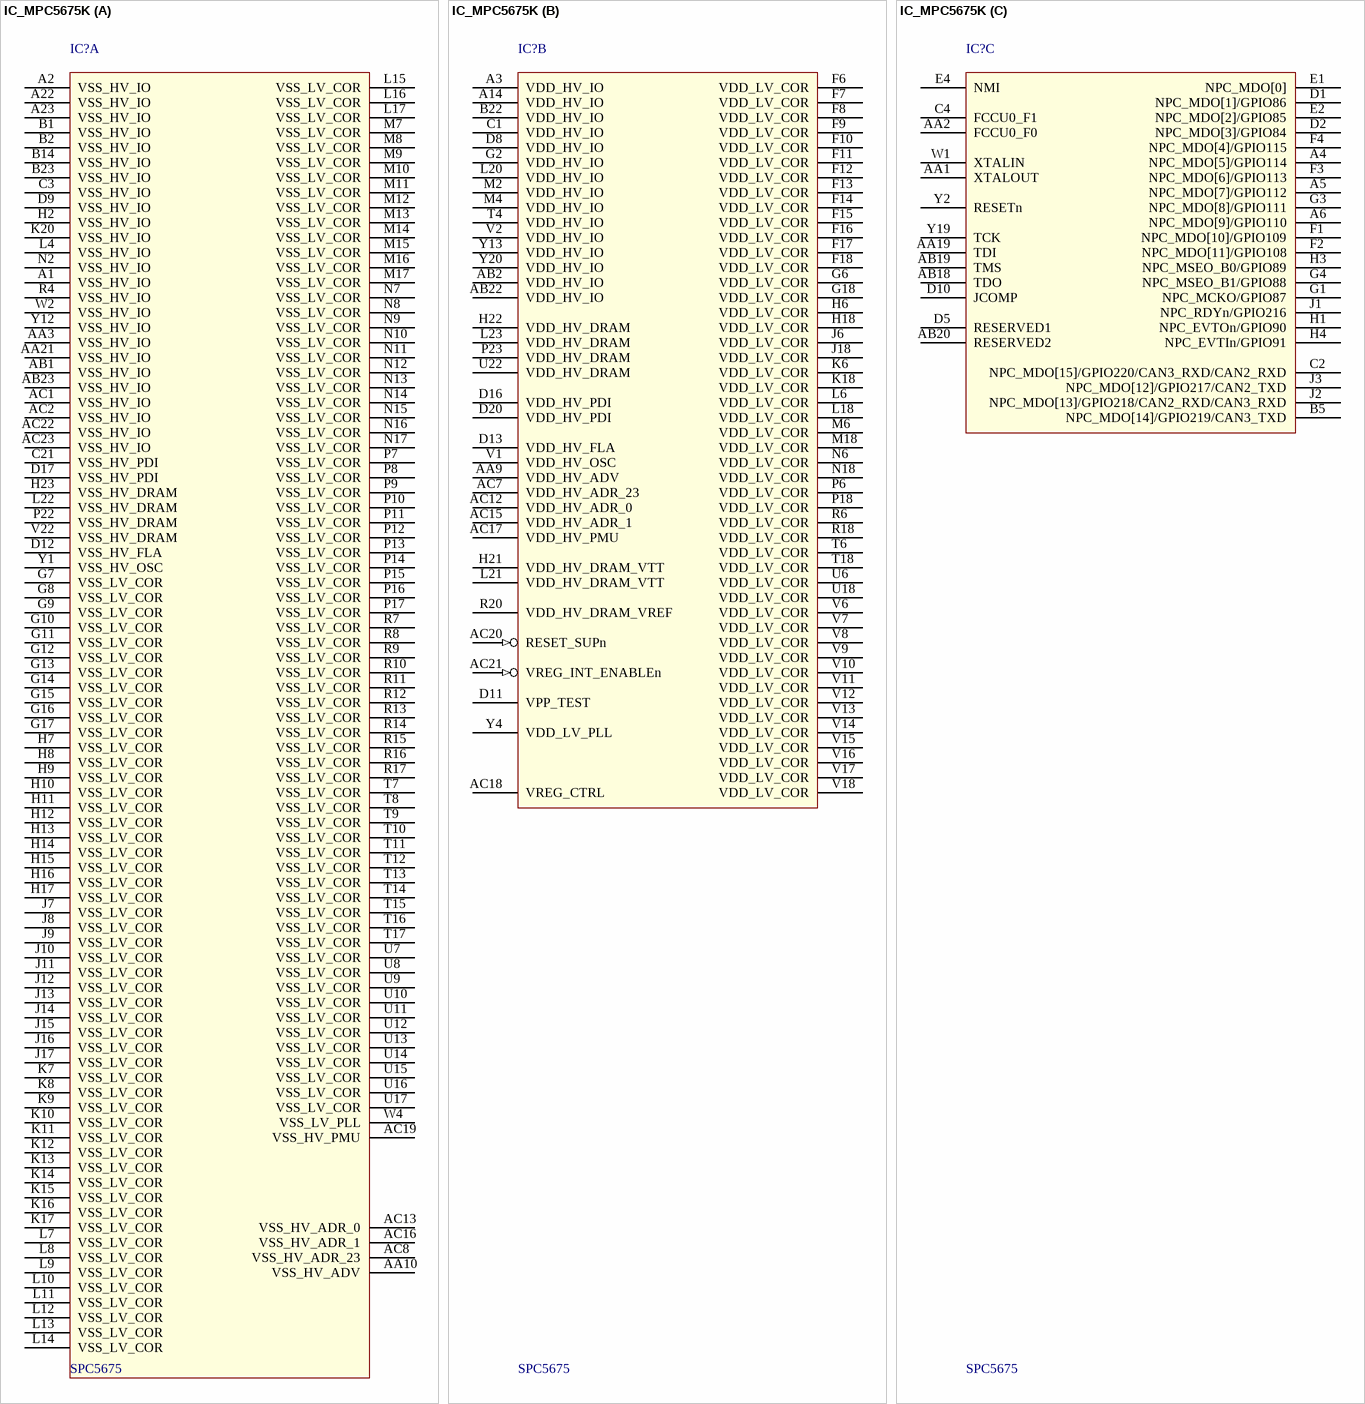
[diagram p13: symbol IC_MPC5675K]

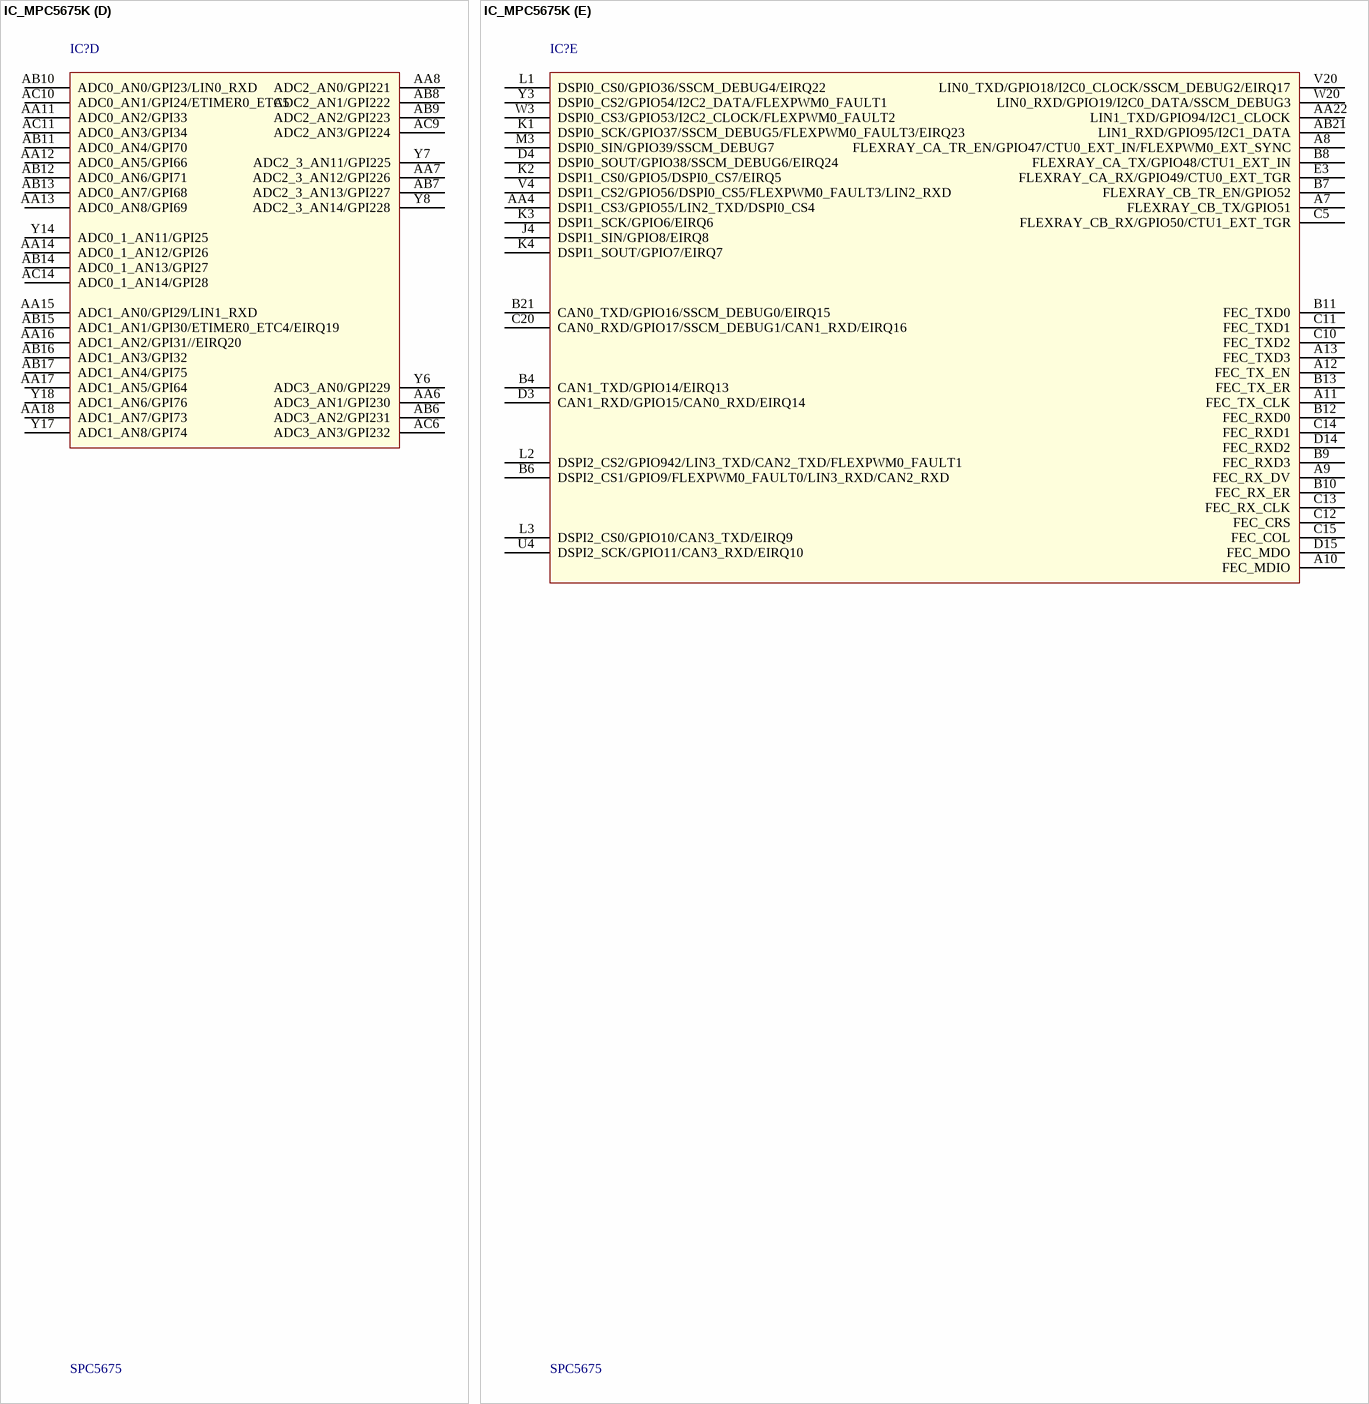
[diagram p14: symbol IC_MPC5675K]

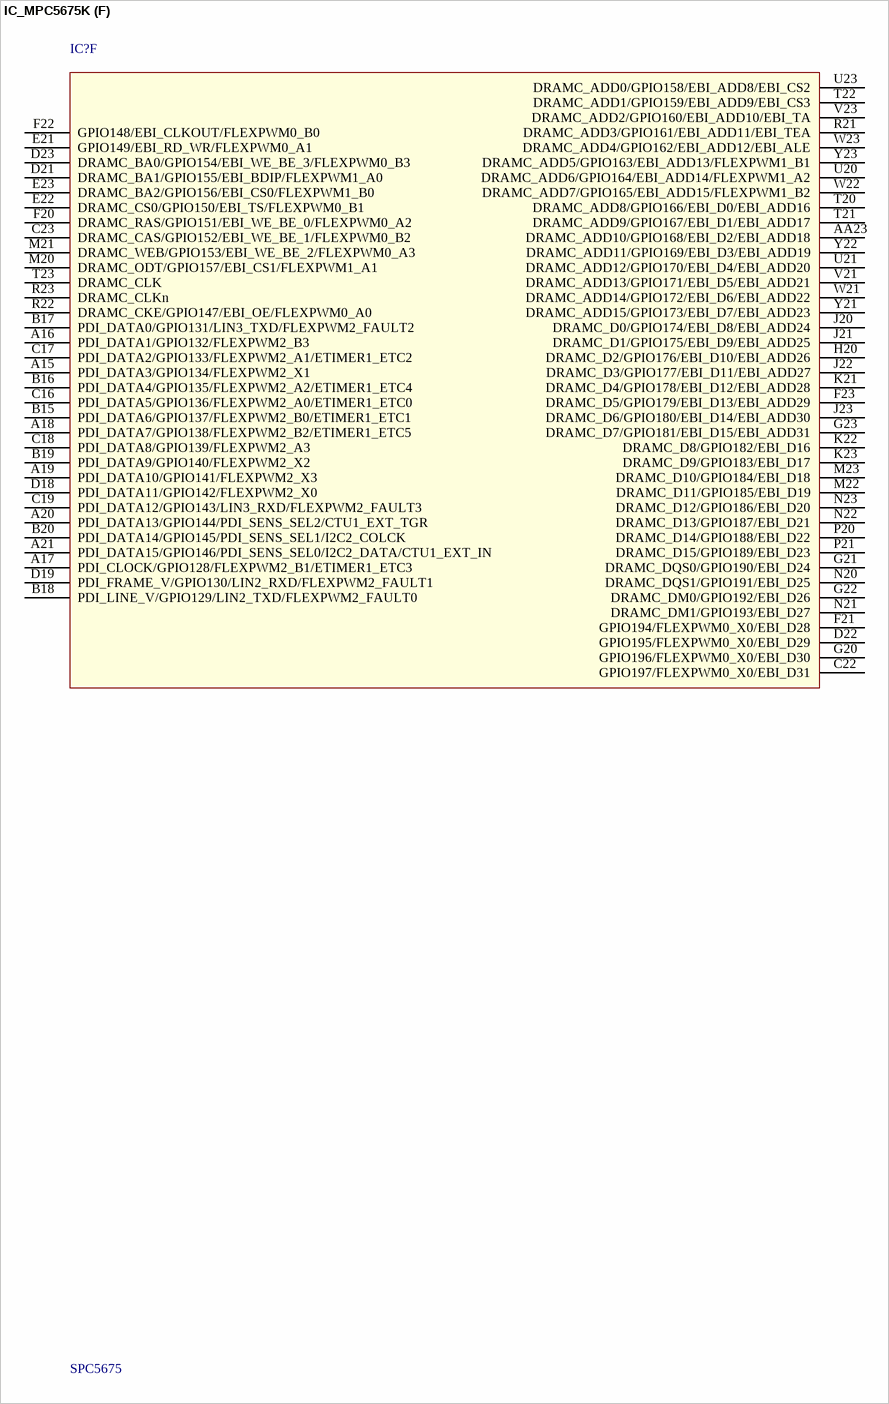
[diagram p15: symbol IC_MPC5675K]

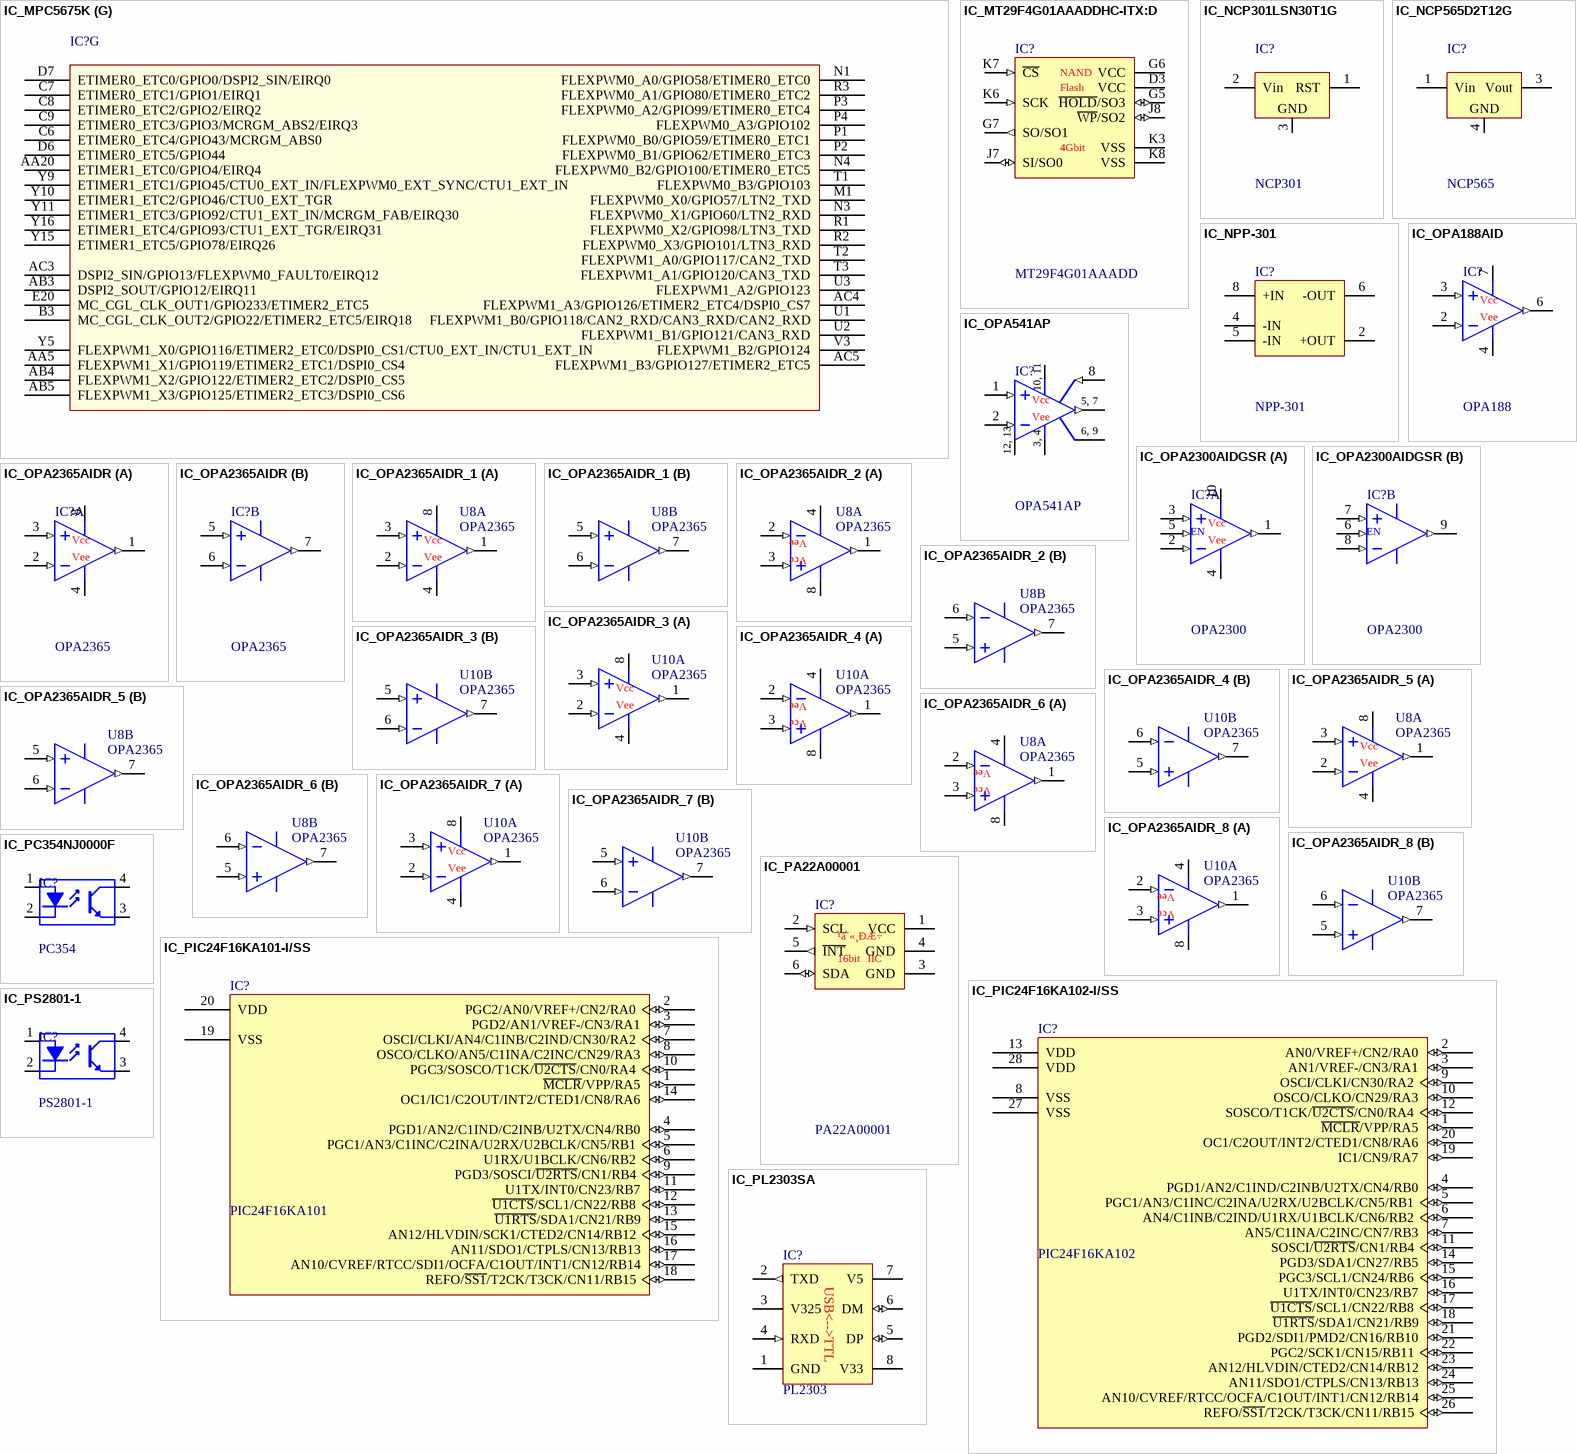
[diagram p16: symbols IC_MPC5675K to IC_PS2801-1]